# Altium footprint library EwgConnectors.PcbLib: 125 footprints (part 2 of 8)
Each footprint in its own frame and in the unit in brackets; x right, y up, seen from the top. Pads: shape width x height; smd on the part's side, far side on the other; paste and mask are expansions set on the pad; w line width, h text height; cw(c..) or ccw(c..) is an arc to the next point about the centre after c.
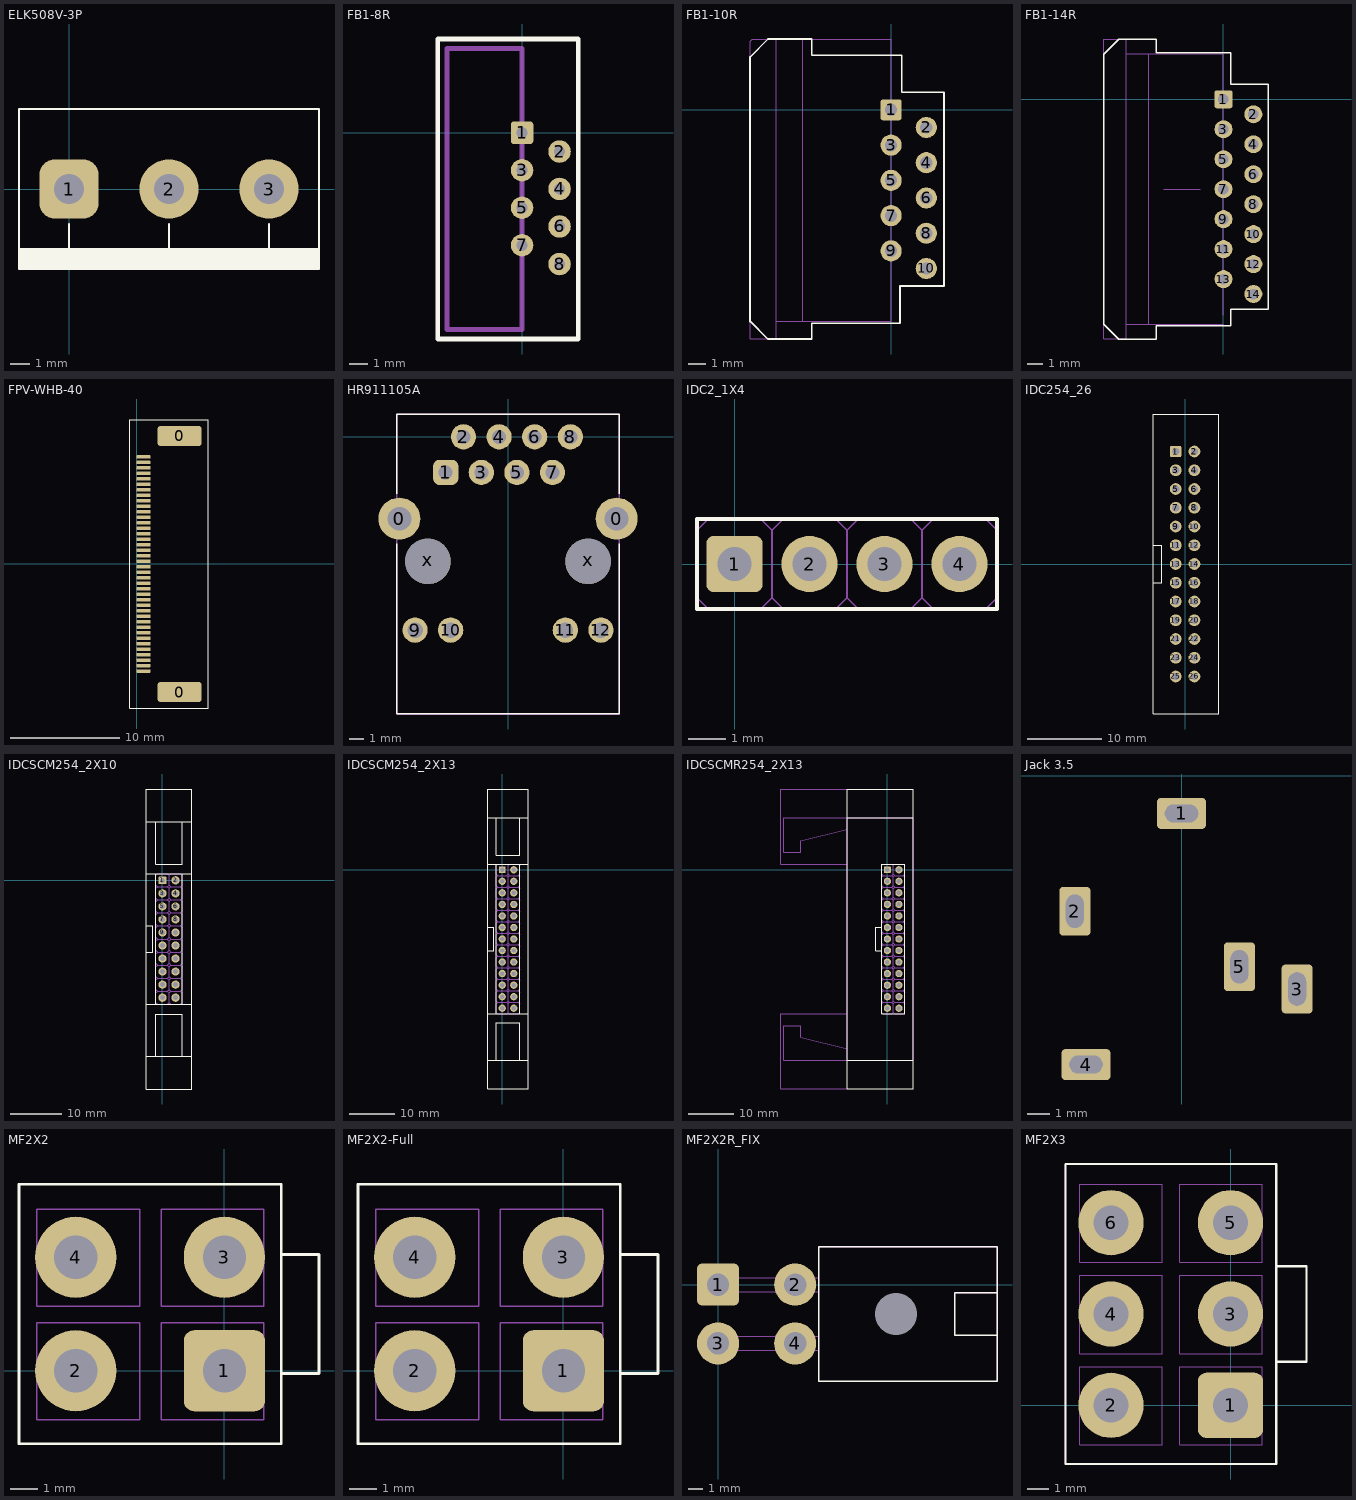
[diagram p1: the footprints below, top view; thin cyan lines are the x and y axes]

## ELK508V-3P [mm] "孰屐祉桕"
height 10
pads (3):
  rrect50% 3x3 hole 1.5: 1(0,0)
  round 3 hole 1.5: 2(5.08,0) 3(10.16,0)
Top Overlay:
  rectangle: -2.54,-4.064 12.7,-3.048
  lines w0.1: -2.54,-3.048 12.7,-3.048 ; 0,-4.064 0,-1.778 ; 5.08,-4.064 5.08,-1.778 ; 10.16,-4.064 10.16,-1.778 ; -2.54,-4.064 12.7,-4.064 12.7,4.064 -2.54,4.064 -2.54,0 -2.54,-4.064
3D body: height 10, standoff -3.5, extent -2.44,-4.061 12.6,4.039

## FB1-8R [mm]
pads (8):
  rrect25% 1.2x1.2 hole 0.6: 1(0,0)
  round 1.2 hole 0.6: 2(2,-1) 3(0,-2) 4(2,-3) 5(0,-4) 6(2,-5) 7(0,-6) 8(2,-7)
Top Overlay:
  lines w0.254: -4.5,-11 3,-11 3,5 -4.5,5 -4.5,-11
Mechanical 1:
  lines w0.254: -4,-10.5 -4,4.5 0,4.5 0,-10.5 -4,-10.5

## FB1-10R [mm]
height 4
pads (10):
  rrect25% 1.2x1.2 hole 0.7: 1(0,0)
  round 1.2 hole 0.7: 2(2,-1) 3(0,-2) 4(2,-3) 5(0,-4) 6(2,-5) 7(0,-6) 8(2,-7) 9(0,-8) 10(2,-9)
Top Overlay:
  lines w0.1: 0.5,-10.85 0.5,-12.1 -4.5,-12.1 -4.5,-13 -7,-13 -8,-12 -8,3 -6.98,4.02 -4.5,4.02 -4.5,3.1 0.6,3.1 0.6,2.7 0.6,1 3,1 3,-10 0.5,-10 ; 0.5,-10.8 0.5,-10.05
Mechanical 1:
  lines w0.05: -6.5,-11.98 -5,-11.98 ; -6.5,4.02 -7.88,4.02 -8,3.9 -8,-12.98 -6.5,-12.98 -6.5,4.02 ; -6.5,4.02 -5,4.02 ; -5,-11.98 -5,4.02 ; -5,-11.98 0,-11.98 0,4.02 -5,4.02
3D body: height 4.02, standoff -3.01, extent -6,-12.498 2.095,3.502

## FB1-14R [mm]
height 4
pads (14):
  rrect25% 1.2x1.2 hole 0.7: 1(0,0)
  round 1.2 hole 0.7: 2(2,-1) 3(0,-2) 4(2,-3) 5(0,-4) 6(2,-5) 7(0,-6) 8(2,-7) 9(0,-8) 10(2,-9) 11(0,-10) 12(2,-11) 13(0,-12) 14(2,-13)
Top Overlay:
  lines w0.1: -8,-15 -8,3 -6.975,4.025 -4.5,4.025 -4.5,3.1 0.5,3.1 0.5,1 3,1 3,-14 0.5,-14 0.5,-14.5 0.5,-15.1 -4.5,-15.1 -4.5,-16 -7,-16 -8,-15
Mechanical 1:
  lines w0.05: -6.5,-15 0,-15 ; -6.5,3.025 -5,3.025 ; -5,-15 -5,3.025 ; -4,-5.988 -1.55,-5.988 ; 0,-13 0,-14.4 0,3.025 -5,3.025 ; -8,-16 -8,4.025 -6.5,4.025 -6.5,-16 -8,-16
3D body: height 4.24, standoff -2.8, extent -6,-15.998 2.095,4.002

## FPV-WHB-40 [mm]
pads (42):
  rrect25% 4x1.8 smd: 0(3.9,-11.65) 0(3.9,11.65)
  rrect25% 1.25x0.3 smd: 1(0.625,9.75) 2(0.625,9.25) 3(0.625,8.75) 4(0.625,8.25) 5(0.625,7.75) 6(0.625,7.25) 7(0.625,6.75) 8(0.625,6.25) 9(0.625,5.75) 10(0.625,5.25) 11(0.625,4.75) 12(0.625,4.25) 13(0.625,3.75) 14(0.625,3.25) 15(0.625,2.75) 16(0.625,2.25) 17(0.625,1.75) 18(0.625,1.25) 19(0.625,0.75) 20(0.625,0.25) 21(0.625,-0.25) 22(0.625,-0.75) 23(0.625,-1.25) 24(0.625,-1.75) 25(0.625,-2.25) 26(0.625,-2.75) 27(0.625,-3.25) 28(0.625,-3.75) 29(0.625,-4.25) 30(0.625,-4.75) 31(0.625,-5.25) 32(0.625,-5.75) 33(0.625,-6.25) 34(0.625,-6.75) 35(0.625,-7.25) 36(0.625,-7.75) 37(0.625,-8.25) 38(0.625,-8.75) 39(0.625,-9.25) 40(0.625,-9.75)
Top Overlay:
  lines w0.1: -0.625,-13.125 6.5,-13.125 6.5,13.125 -0.625,13.125 -0.625,-13.125
3D body: height 2, standoff 0, extent -0.15,-12.05 5.75,12.05

## HR911105A [mm]
pads (16):
  round 3 hole 1.7: 0(-7.747,-5.842) 0(7.747,-5.842)
  rrect50% 1.8x1.8 hole 1: 1(-4.445,-2.54)
  round 1.8 hole 1: 2(-3.175,0) 3(-1.905,-2.54) 4(-0.635,0) 5(0.635,-2.54) 6(1.905,0) 7(3.175,-2.54) 8(4.445,0)
  round 1.8 hole 1.1: 9(-6.629,-13.792) 10(-4.089,-13.792) 11(4.089,-13.792) 12(6.629,-13.792)
  round 3.25 hole 3.25 unplated: x(-5.715,-8.89) x(5.715,-8.89)
Top Overlay:
  lines w0.1: -7.95,-7.62 -7.95,-19.761 7.95,-19.761 7.95,-7.62 ; -7.95,-4.064 -7.95,1.626 7.95,1.626 7.95,-4.064
Mechanical 1:
  lines w0.1: -7.94,-19.774 -7.94,1.626 7.94,1.626 7.94,-19.775 -7.94,-19.775
3D body: height 13.5, standoff -3, extent -7.94,-19.774 7.94,1.626

## IDC2_1X4 [mm]
pads (4):
  rrect25% 1.5x1.5 hole 0.9: 1(0,0)
  round 1.5 hole 0.9: 2(2,0) 3(4,0) 4(6,0)
Top Overlay:
  lines w0.1: -1,-1.2 -1,1.2 7,1.2 7,-1.2 -1,-1.2
Mechanical 1:
  lines w0.05: 1,-0.9 0.7,-1.2 -0.7,-1.2 -1,-0.9 -1,0.9 -0.7,1.2 0.7,1.2 1,0.9 ; 1,-0.9 1.3,-1.2 2.7,-1.2 3,-0.9 ; 1,-0.9 1,0.9 ; 1,0.9 1.3,1.2 2.7,1.2 3,0.9 ; 3,-0.9 3.3,-1.2 4.7,-1.2 5,-0.9 ; 3,-0.9 3,0.9 ; 3,0.9 3.3,1.2 4.7,1.2 5,0.9 ; 5,-0.9 5.3,-1.2 6.7,-1.2 7,-0.9 7,0.9 6.7,1.2 5.3,1.2 5,0.9 ; 5,-0.9 5,0.9 ; -0.3,-0.3 0.3,-0.3 0.3,0.3 -0.3,0.3 -0.3,-0.3 ; 1.7,-0.3 2.3,-0.3 2.3,0.3 1.7,0.3 1.7,-0.3 ; 3.7,-0.3 3.7,0.3 4.3,0.3 4.3,-0.3 3.7,-0.3 ; 5.7,-0.3 6.3,-0.3 6.3,0.3 5.7,0.3 5.7,-0.3
3D body: height 5.7, standoff -3, extent -1,-1.2 7,1.2

## IDC254_26 [mm]
pads (26):
  rrect25% 1.524x1.524 hole 0.965: 1(-1.27,15.24)
  round 1.6 hole 0.965: 2(1.27,15.24) 3(-1.27,12.7) 4(1.27,12.7) 5(-1.27,10.16) 6(1.27,10.16) 7(-1.27,7.62) 8(1.27,7.62) 9(-1.27,5.08) 10(1.27,5.08) 11(-1.27,2.54) 12(1.27,2.54) 13(-1.27,0) 14(1.27,0) 15(-1.27,-2.54) 16(1.27,-2.54) 17(-1.27,-5.08) 18(1.27,-5.08) 19(-1.27,-7.62) 20(1.27,-7.62) 21(-1.27,-10.16) 22(1.27,-10.16) 23(-1.27,-12.7) 24(1.27,-12.7) 25(-1.27,-15.24) 26(1.27,-15.24)
Top Overlay:
  lines w0.1: -4.318,-2.54 -3.175,-2.54 -3.175,2.54 -4.318,2.54 ; -4.318,-20.32 4.572,-20.32 4.572,20.32 -4.318,20.32 -4.318,-20.32
3D body: height 9.13, standoff -3.27, extent -4.27,-20.27 4.58,20.35

## IDCSCM254_2X10 [mm]
pads (20):
  rrect25% 1.524x1.524 hole 0.965: 1(0,0)
  round 1.6 hole 0.965: 2(2.54,0) 3(0,-2.54) 4(2.54,-2.54) 5(0,-5.08) 6(2.54,-5.08) 7(0,-7.62) 8(2.54,-7.62) 9(0,-10.16) 10(2.54,-10.16) 11(0,-12.7) 12(2.54,-12.7) 13(0,-15.24) 14(2.54,-15.24) 15(0,-17.78) 16(2.54,-17.78) 17(0,-20.32) 18(2.54,-20.32) 19(0,-22.86) 20(2.54,-22.86)
Top Overlay:
  lines w0.1: -3.175,-24.13 5.715,-24.13 ; -3.175,-13.97 -1.905,-13.97 -1.905,-8.89 -3.175,-8.89 ; -3.175,1.27 5.715,1.27 ; -1.27,-34.29 -1.27,-26.035 3.81,-26.035 3.81,-34.29 ; -1.27,11.43 -1.27,3.175 3.81,3.175 3.81,11.43 ; -3.175,-34.29 -3.175,-40.64 5.715,-40.64 5.715,-34.29 ; -3.175,-34.29 -3.175,11.43 ; -3.175,-34.29 5.715,-34.29 ; -3.175,11.43 -3.175,17.78 5.715,17.78 5.715,11.43 ; -3.175,11.43 5.715,11.43 ; 5.715,-34.29 5.715,11.43 ; -1.27,-24.13 -1.27,-16.51 -1.27,-13.97 -1.27,-11.43 -1.27,-8.89 -1.27,-6.35 -1.27,-3.81 -1.27,-1.27 -1.27,1.27 3.81,1.27 3.81,-1.27 3.81,-3.81 3.81,-6.35 3.81,-8.89 3.81,-11.43 3.81,-13.97 3.81,-16.51 3.81,-24.13 -1.27,-24.13
Mechanical 1:
  drawing of 228 lines, arcs and shapes, not listed

## IDCSCM254_2X13 [mm]
pads (26):
  rrect25% 1.524x1.524 hole 0.965: 1(0,0)
  round 1.6 hole 0.965: 2(2.54,0) 3(0,-2.54) 4(2.54,-2.54) 5(0,-5.08) 6(2.54,-5.08) 7(0,-7.62) 8(2.54,-7.62) 9(0,-10.16) 10(2.54,-10.16) 11(0,-12.7) 12(2.54,-12.7) 13(0,-15.24) 14(2.54,-15.24) 15(0,-17.78) 16(2.54,-17.78) 17(0,-20.32) 18(2.54,-20.32) 19(0,-22.86) 20(2.54,-22.86) 21(0,-25.4) 22(2.54,-25.4) 23(0,-27.94) 24(2.54,-27.94) 25(0,-30.48) 26(2.54,-30.48)
Top Overlay:
  lines w0.1: -3.175,-31.75 5.715,-31.75 ; -3.175,-17.78 -1.905,-17.78 -1.905,-12.7 -3.175,-12.7 ; -3.175,1.27 5.715,1.27 ; -1.27,-41.91 -1.27,-33.655 3.81,-33.655 3.81,-41.91 ; -1.27,11.43 -1.27,3.175 3.81,3.175 3.81,11.43 ; -3.175,-41.91 5.715,-41.91 ; -3.175,-41.91 -3.175,11.43 ; -3.175,-41.91 -3.175,-48.26 5.715,-48.26 5.715,-41.91 ; -3.175,11.43 5.715,11.43 ; -3.175,11.43 -3.175,17.78 5.715,17.78 5.715,11.43 ; 5.715,-41.91 5.715,11.43 ; -1.27,-31.75 3.81,-31.75 3.81,-24.13 3.81,-16.51 3.81,-13.97 3.81,-11.43 3.81,-8.89 3.81,-6.35 3.81,-3.81 3.81,-1.27 3.81,1.27 -1.27,1.27 -1.27,-1.27 -1.27,-3.81 -1.27,-6.35 -1.27,-8.89 -1.27,-11.43 -1.27,-13.97 -1.27,-16.51 -1.27,-24.13 -1.27,-31.75
Mechanical 1:
  drawing of 299 lines, arcs and shapes, not listed

## IDCSCMR254_2X13 [mm]
pads (26):
  rrect25% 1.524x1.524 hole 0.965: 1(0,0)
  round 1.6 hole 0.965: 2(2.54,0) 3(0,-2.54) 4(2.54,-2.54) 5(0,-5.08) 6(2.54,-5.08) 7(0,-7.62) 8(2.54,-7.62) 9(0,-10.16) 10(2.54,-10.16) 11(0,-12.7) 12(2.54,-12.7) 13(0,-15.24) 14(2.54,-15.24) 15(0,-17.78) 16(2.54,-17.78) 17(0,-20.32) 18(2.54,-20.32) 19(0,-22.86) 20(2.54,-22.86) 21(0,-25.4) 22(2.54,-25.4) 23(0,-27.94) 24(2.54,-27.94) 25(0,-30.48) 26(2.54,-30.48)
Top Overlay:
  lines w0.1: -8.89,-41.91 5.715,-41.91 ; -1.27,-17.78 -2.54,-17.78 -2.54,-12.7 -1.27,-12.7 ; -8.89,11.43 -8.89,17.78 5.715,17.78 5.715,11.43 ; -8.89,11.43 -8.89,-48.26 5.715,-48.26 5.715,11.43 ; -8.89,11.43 5.715,11.43 ; -1.27,-31.75 -1.27,-24.13 -1.27,-16.51 -1.27,-13.97 -1.27,-11.43 -1.27,-8.89 -1.27,-6.35 -1.27,-3.81 -1.27,-1.27 -1.27,1.27 ; -1.27,-31.75 3.81,-31.75 ; -1.27,-31.75 3.81,-31.75 ; -1.27,1.27 3.81,1.27 ; -1.27,1.27 3.81,1.27 ; 3.81,-31.75 3.81,-24.13 3.81,-16.51 3.81,-13.97 3.81,-11.43 3.81,-8.89 3.81,-6.35 3.81,-3.81 3.81,-1.27 3.81,1.27
Mechanical 1:
  drawing of 319 lines, arcs and shapes, not listed

## Jack 3.5 [mm]
pads (5):
  rrect25% 2.2x1.4 hole 0.8 slot 1.5 at 0 deg: 1(0,-1.7) 4(-4.3,-13)
  rrect25% 1.4x2.2 hole 0.8 slot 1.5 at 90 deg: 2(-4.8,-6.1) 3(5.2,-9.6) 5(2.6,-8.6)
3D body: height 6, standoff -3, extent -5.85,-13.8 5.65,3.7

## MF2X2 [mm]
pads (4):
  rrect25% 3x3 hole 1.6: 1(0,0)
  round 3 hole 1.6: 2(-5.5,0) 3(0,4.2) 4(-5.5,4.2)
Top Overlay:
  lines w0.1: 2.1,-0.1 3.5,-0.1 3.5,4.3 2.1,4.3 ; -7.6,-2.7 2.1,-2.7 2.1,6.9 -7.6,6.9 -7.6,-2.7
Mechanical 1:
  lines w0.05: -7.6,-2.7 2.1,-2.7 2.1,6.9 -7.6,6.9 -7.6,-2.7 ; -6.94,-1.82 -3.14,-1.82 -3.14,1.78 -6.94,1.78 -6.94,-1.82 ; -6.94,2.38 -6.94,5.98 -3.14,5.98 -3.14,2.38 -6.94,2.38 ; -2.34,-1.82 1.46,-1.82 1.46,1.78 -2.34,1.78 -2.34,-1.82 ; -2.34,2.38 -2.34,5.98 1.46,5.98 1.46,2.38 -2.34,2.38
3D body: height 12.7, standoff -3, extent -7.5,-2.6 3.4,6.8

## MF2X2-Full [mm]
pads (4):
  rrect25% 3x3 hole 1.6: 1(0,0)
  round 3 hole 1.6: 2(-5.5,0) 3(0,4.2) 4(-5.5,4.2)
Top Overlay:
  lines w0.1: 2.1,-0.1 3.5,-0.1 3.5,4.3 2.1,4.3 ; -7.6,-2.7 -7.6,6.9 2.1,6.9 2.1,-2.7 -7.6,-2.7
Mechanical 1:
  lines w0.05: -7.6,-2.7 -7.6,6.9 2.1,6.9 2.1,-2.7 -7.6,-2.7 ; -6.94,-1.82 -6.94,1.78 -3.14,1.78 -3.14,-1.82 -6.94,-1.82 ; -6.94,2.38 -3.14,2.38 -3.14,5.98 -6.94,5.98 -6.94,2.38 ; -2.34,-1.82 -2.34,1.78 1.46,1.78 1.46,-1.82 -2.34,-1.82 ; -2.34,2.38 1.46,2.38 1.46,5.98 -2.34,5.98 -2.34,2.38
3D body: height 23.5, standoff -3, extent -8.5,-2.6 5.8,6.8

## MF2X2R_FIX [mm]
pads (5):
  round 0 hole 3: 0(12.7,-2.1)
  rrect25% 3x3 hole 1.6: 1(0,0)
  round 3 hole 1.6: 2(5.5,0) 3(0,-4.2) 4(5.5,-4.2)
Top Overlay:
  lines w0.1: 19.9,-3.6 16.9,-3.6 16.9,-0.6 19.9,-0.6 ; 7.2,-6.9 19.9,-6.9 19.9,2.7 7.2,2.7 7.2,-6.9
Mechanical 1:
  lines w0.05: 7.2,-4.7 -0.6,-4.7 -0.6,-4.6 -0.6,-3.7 7.2,-3.7 ; 7.2,-0.5 -0.6,-0.5 -0.6,-0.4 -0.6,0.5 7.2,0.5 ; 19.9,-3.6 16.9,-3.6 16.9,-2.1 16.9,-0.6 19.9,-0.6 ; 7.2,-6.9 19.9,-6.9 19.9,2.7 7.2,2.7 7.2,-6.9
3D body: height 11.4, standoff -3.6, extent -0.535,-6.9 19.4,3.1

## MF2X3 [mm]
pads (6):
  rrect25% 3x3 hole 1.6: 1(0,0)
  round 3 hole 1.6: 2(-5.5,0) 3(0,4.2) 4(-5.5,4.2) 5(0,8.4) 6(-5.5,8.4)
Top Overlay:
  lines w0.1: 2.1,2 3.5,2 3.5,6.4 2.1,6.4 ; -7.6,-2.7 2.1,-2.7 2.1,11.1 -7.6,11.1 -7.6,-2.7
Mechanical 1:
  lines w0.05: -6.94,2.38 -6.94,5.98 ; -6.94,2.38 -6.94,5.98 ; -6.94,2.38 -3.14,2.38 ; -6.94,2.38 -3.14,2.38 ; -6.94,5.98 -3.14,5.98 ; -6.94,5.98 -3.14,5.98 ; -6.94,6.58 -6.94,10.18 ; -6.94,6.58 -6.94,10.18 ; -6.94,6.58 -3.14,6.58 ; -6.94,6.58 -3.14,6.58 ; -6.94,10.18 -3.14,10.18 ; -6.94,10.18 -3.14,10.18 ; -3.14,2.38 -3.14,5.98 ; -3.14,2.38 -3.14,5.98 ; -3.14,6.58 -3.14,10.18 ; -3.14,6.58 -3.14,10.18 ; -2.34,2.38 -2.34,5.98 ; -2.34,2.38 -2.34,5.98 ; -2.34,2.38 1.46,2.38 ; -2.34,2.38 1.46,2.38 ; -2.34,5.98 1.46,5.98 ; -2.34,5.98 1.46,5.98 ; -2.34,6.58 -2.34,10.18 ; -2.34,6.58 -2.34,10.18 ; -2.34,6.58 1.46,6.58 ; -2.34,6.58 1.46,6.58 ; -2.34,10.18 1.46,10.18 ; -2.34,10.18 1.46,10.18 ; 1.46,2.38 1.46,5.98 ; 1.46,2.38 1.46,5.98 ; 1.46,6.58 1.46,10.18 ; 1.46,6.58 1.46,10.18 ; -7.6,-2.7 2.1,-2.7 2.1,11.1 -7.6,11.1 -7.6,-2.7 ; -6.94,-1.82 -3.14,-1.82 -3.14,1.78 -6.94,1.78 -6.94,-1.82 ; -2.34,-1.82 1.46,-1.82 1.46,1.78 -2.34,1.78 -2.34,-1.82